# Altium footprint library cool_library.PcbLib: 1182 footprints (part 52 of 75)
Each footprint in its own frame and in the unit in brackets; x right, y up, seen from the top. Pads: shape width x height; smd on the part's side, far side on the other; paste and mask are expansions set on the pad; w line width, h text height; cw(c..) or ccw(c..) is an arc to the next point about the centre after c.
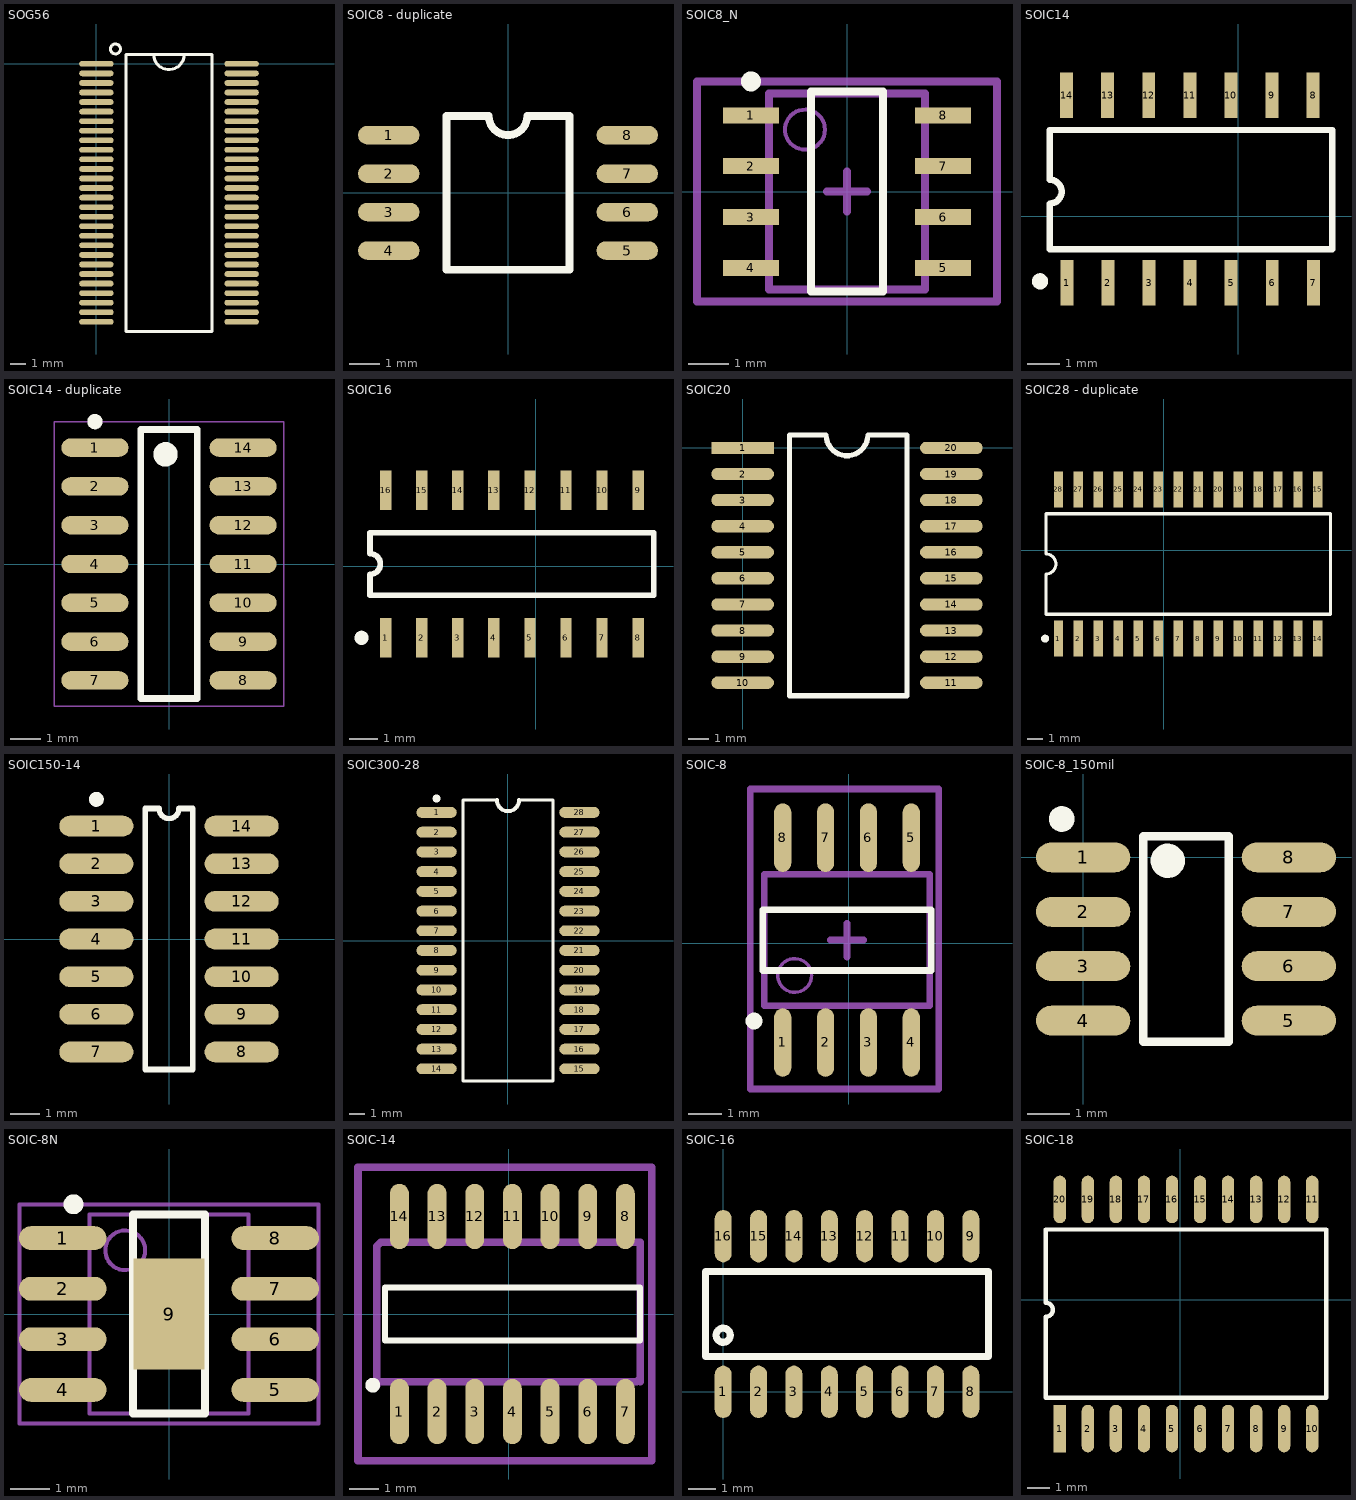
[diagram p51: the footprints below, top view; thin cyan lines are the x and y axes]

## SOG56 [mil]
pads (56):
  oval 90x15 smd: 1(0,0) 2(0,-25) 3(0,-50) 4(0,-75) 5(0,-100) 6(0,-125) 7(0,-150) 8(0,-175) 9(0,-200) 10(0,-225) 11(0,-250) 12(0,-275) 13(0,-300) 14(0,-325) 15(0,-350) 16(0,-375) 17(0,-400) 18(0,-425) 19(0,-450) 20(0,-475) 21(0,-500) 22(0,-525) 23(0,-550) 24(0,-575) 25(0,-600) 26(0,-625) 27(0,-650) 28(0,-675) 29(380,-675) 30(380,-650) 31(380,-625) 32(380,-600) 33(380,-575) 34(380,-550) 35(380,-525) 36(380,-500) 37(380,-475) 38(380,-450) 39(380,-425) 40(380,-400) 41(380,-375) 42(380,-350) 43(380,-325) 44(380,-300) 45(380,-275) 46(380,-250) 47(380,-225) 48(380,-200) 49(380,-175) 50(380,-150) 51(380,-125) 52(380,-100) 53(380,-75) 54(380,-50) 55(380,-25) 56(380,0)
Top Overlay:
  circle w8: c49.96,39 r13.04
  lines w8: 149.88,25 ccw(c189.88,25) 229.88,25 ; 78,-700 302,-700 302,25 78,25 78,-700

## SOIC8 - duplicate [mil]
pads (8):
  oval 80x24 smd: 1(-155,75) 2(-155,25) 3(-155,-25) 4(-155,-75) 5(155,-75) 6(155,-25) 7(155,25) 8(155,75)
Top Overlay:
  lines w10: -80,-100 -80,100 -25,100 ccw(c0,100) 25,100 80,100 80,-100 -80,-100
3D body: height 90.55, standoff -0.78, extent -167.2,-105.9 163.21,105.91

## SOIC8_N [mm] "SOIC, 8-Leads, Body 4.9x3.9mm, Pitch 1.27mm, IPC Medium Density"
height 1.75
pads (8):
  rect 1.4x0.4 smd: 1(-2.4,1.905) 2(-2.4,0.635) 3(-2.4,-0.635) 4(-2.4,-1.905) 5(2.4,-1.905) 6(2.4,-0.635) 7(2.4,0.635) 8(2.4,1.905)
Top Overlay:
  circle w0.25: c-2.4,2.755 r0.125
  lines w0.2: -0.9,-2.5 -0.9,2.5 0.9,2.5 0.9,-2.5 -0.9,-2.5
Mechanical 13:
  circle w0.1: c-1.05,1.55 r0.5
  lines w0.2: -1.95,-2.45 -1.95,2.45 1.95,2.45 1.95,-2.45 -1.95,-2.45
Mechanical 15:
  lines w0.2: -0.5,0 0.5,0 ; 0,-0.5 0,0.5 ; -3.75,-2.75 -3.75,2.75 3.75,2.75 3.75,-2.75 -3.75,-2.75
3D body: height 1.75, standoff 0, extent -1.95,-2.45 1.95,2.45

## SOIC14 [mm]
pads (14):
  rect 0.4x1.4 smd: 1(-5.3,-2.059) 2(-4.03,-2.059) 3(-2.76,-2.059) 4(-1.49,-2.059) 5(-0.22,-2.059) 6(1.05,-2.059) 7(2.32,-2.059) 8(2.31,3.73) 9(1.04,3.73) 10(-0.23,3.73) 11(-1.5,3.73) 12(-2.77,3.73) 13(-4.04,3.73) 14(-5.31,3.73)
Top Overlay:
  circle w0.25: c-6.13,-2.019 r0.125
  lines w0.2: -5.835,0.35 -5.835,-1.029 2.91,-1.029 2.91,2.66 -5.835,2.66 -5.835,1.13 ; -5.83,0.387 ccw(c-5.83,0.753) -5.83,1.12

## SOIC14 - duplicate [mm]
height 1.75
pads (14):
  oval 2.2x0.6 smd: 1(-2.425,3.81) 2(-2.425,2.54) 3(-2.425,1.27) 4(-2.425,0) 5(-2.425,-1.27) 6(-2.425,-2.54) 7(-2.425,-3.81) 8(2.425,-3.81) 9(2.425,-2.54) 10(2.425,-1.27) 11(2.425,0) 12(2.425,1.27) 13(2.425,2.54) 14(2.425,3.81)
Top Overlay:
  circle w0.25: c-2.425,4.66 r0.125
  circle w0.4: c-0.115,3.59 r0.2
  lines w0.22: -0.925,-4.4 -0.925,4.4 0.925,4.4 0.925,-4.4 -0.925,-4.4
Mechanical 15:
  lines w0.05: -3.75,-4.65 -3.75,4.65 3.75,4.65 3.75,-4.65 -3.75,-4.65
3D body: height 1.75, standoff 0, extent -2.896,-4.237 2.904,4.293

## SOIC16 [mm]
pads (16):
  rect 0.4x1.4 smd: 1(-5.28,-2.529) 2(-4.01,-2.529) 3(-2.74,-2.529) 4(-1.47,-2.529) 5(-0.2,-2.529) 6(1.07,-2.529) 7(2.34,-2.529) 8(3.61,-2.529) 9(3.61,2.671) 10(2.34,2.671) 11(1.07,2.671) 12(-0.2,2.671) 13(-1.47,2.671) 14(-2.74,2.671) 15(-4.01,2.671) 16(-5.28,2.671)
Top Overlay:
  circle w0.25: c-6.13,-2.529 r0.125
  lines w0.2: -5.835,-1.029 -5.835,-0.296 ccw(c-5.835,0.071) -5.835,0.438 -5.835,1.171 4.165,1.171 4.165,-1.029 -5.835,-1.029

## SOIC20 [mm]
pads (20):
  rect 3.048x0.6 smd: 1(0,0)
  oval 3.048x0.6 smd: 2(0,-1.27) 3(0,-2.54) 4(0,-3.81) 5(0,-5.08) 6(0,-6.35) 7(0,-7.62) 8(0,-8.89) 9(0,-10.16) 10(0,-11.43) 11(10.16,-11.43) 12(10.16,-10.16) 13(10.16,-8.89) 14(10.16,-7.62) 15(10.16,-6.35) 16(10.16,-5.08) 17(10.16,-3.81) 18(10.16,-2.54) 19(10.16,-1.27) 20(10.16,0)
Top Overlay:
  lines w0.254: 2.286,-12.065 2.286,0.635 4.064,0.635 ccw(c5.08,0.635) 6.096,0.635 8.001,0.635 8.001,-12.065 2.286,-12.065
3D body: height 2.65, standoff 0, extent -0.045,-12.09 10.255,0.71

## SOIC28 - duplicate [mm]
pads (28):
  rect 0.6x2.3 smd: 1(-6.714,-5.635) 2(-5.444,-5.635) 3(-4.174,-5.635) 4(-2.904,-5.635) 5(-1.634,-5.635) 6(-0.364,-5.635) 7(0.906,-5.635) 8(2.176,-5.635) 9(3.446,-5.635) 10(4.716,-5.635) 11(5.986,-5.635) 12(7.256,-5.635) 13(8.526,-5.635) 14(9.796,-5.635) 15(9.796,3.865) 16(8.526,3.865) 17(7.256,3.865) 18(5.986,3.865) 19(4.716,3.865) 20(3.446,3.865) 21(2.176,3.865) 22(0.906,3.865) 23(-0.364,3.865) 24(-1.634,3.865) 25(-2.904,3.865) 26(-4.174,3.865) 27(-5.444,3.865) 28(-6.714,3.865)
Top Overlay:
  circle w0.25: c-7.564,-5.635 r0.125
  lines w0.2: -7.509,-4.085 10.591,-4.085 10.591,2.315 -7.509,2.315 -7.509,-0.25 cw(c-7.509,-0.885) -7.509,-1.52 -7.509,-4.085

## SOIC150-14 [mm] "SOIC, 14-Leads, Body 8.7x3.9mm, Pitch 1.27mm, IPC Low Density"
height 1.76
pads (14):
  oval 2.5x0.7 smd: 1(-2.45,3.81) 2(-2.45,2.54) 3(-2.45,1.27) 4(-2.45,0) 5(-2.45,-1.27) 6(-2.45,-2.54) 7(-2.45,-3.81) 8(2.45,-3.81) 9(2.45,-2.54) 10(2.45,-1.27) 11(2.45,0) 12(2.45,1.27) 13(2.45,2.54) 14(2.45,3.81)
Top Overlay:
  circle w0.25: c-2.45,4.71 r0.125
  lines w0.178: -0.336,4.4 ccw(c0,4.4) 0.336,4.4
  lines w0.2: -0.8,4.4 -0.8,-4.4 0.8,-4.4 0.8,4.4
  lines w0.203: -0.8,4.4 -0.336,4.4 ; 0.336,4.4 0.8,4.4

## SOIC300-28 [mm] "SOIC, 28-Leads, Body 17.9x7.5mm, Pitch 1.27mm, IPC Low Density"
height 2.65
pads (28):
  oval 2.6x0.7 smd: 1(-4.6,8.255) 2(-4.6,6.985) 3(-4.6,5.715) 4(-4.6,4.445) 5(-4.6,3.175) 6(-4.6,1.905) 7(-4.6,0.635) 8(-4.6,-0.635) 9(-4.6,-1.905) 10(-4.6,-3.175) 11(-4.6,-4.445) 12(-4.6,-5.715) 13(-4.6,-6.985) 14(-4.6,-8.255) 15(4.6,-8.255) 16(4.6,-6.985) 17(4.6,-5.715) 18(4.6,-4.445) 19(4.6,-3.175) 20(4.6,-1.905) 21(4.6,-0.635) 22(4.6,0.635) 23(4.6,1.905) 24(4.6,3.175) 25(4.6,4.445) 26(4.6,5.715) 27(4.6,6.985) 28(4.6,8.255)
Top Overlay:
  circle w0.25: c-4.6,9.155 r0.125
  lines w0.2: -2.9,9.05 -2.9,-9.05 2.9,-9.05 2.9,9.05
  lines w0.203: -2.9,9.05 -0.715,9.05 ; 0.715,9.05 2.9,9.05
  lines w0.254: -0.715,9.05 ccw(c0,9.05) 0.715,9.05

## SOIC-8 [mil]
pads (8):
  oval 20x80 smd: 1(-77.09,-115.71) 2(-27.09,-115.71) 3(22.91,-115.71) 4(72.91,-115.71) 5(72.91,123.27) 6(22.91,123.27) 7(-27.09,123.27) 8(-77.09,123.27)
Top Overlay:
  circle w9.84: c-110.55,-90.71 r4.92
  lines w7.87: -100.51,-31.65 96.34,-31.65 96.34,39.21 -100.51,39.21 -100.51,-31.65
Mechanical 13:
  circle w3.94: c-63.11,-37.56 r19.68
  lines w7.87: -98.54,-72.99 94.37,-72.99 94.37,80.55 -98.54,80.55 -98.54,-72.99
Mechanical 15:
  lines w7.87: -21.77,3.78 17.6,3.78 ; -2.09,-15.91 -2.09,23.46 ; -115,-170 105,-170 105,180 -115,180 -115,-170
3D body: height 66.93, standoff 0, extent -96.46,-113.1 96.46,123.12

## SOIC-8_150mil [mm]
height 8.23
pads (8):
  oval 2.2x0.7 smd: 1(0,0) 2(0,-1.27) 3(0,-2.54) 4(0,-3.81) 5(4.8,-3.81) 6(4.8,-2.54) 7(4.8,-1.27) 8(4.8,0)
Top Overlay:
  circle w0.4: c1.975,-0.08 r0.2
  circle w0.3: c-0.5,0.895 r0.15
  lines w0.2: 1.4,-4.305 3.4,-4.305 3.4,0.495 1.4,0.495 1.4,-4.305

## SOIC-8N [mm] "SOIC, has a pad under it"
height 1.75
pads (9):
  oval 2.2x0.6 smd: 1(-2.667,1.905) 2(-2.667,0.635) 3(-2.667,-0.635) 4(-2.667,-1.905) 5(2.667,-1.905) 6(2.667,-0.635) 7(2.667,0.635) 8(2.667,1.905)
  rect 1.778x2.794 smd: 9(0,0)
Top Overlay:
  circle w0.25: c-2.4,2.755 r0.125
  lines w0.2: -0.9,-2.5 -0.9,2.5 0.9,2.5 0.9,-2.5 -0.9,-2.5
Mechanical 13:
  circle w0.1: c-1.1,1.6 r0.5
  lines w0.1: -2,-2.5 -2,2.5 2,2.5 2,-2.5 -2,-2.5
Mechanical 15:
  lines w0.1: -0.5,0 0.5,0 ; 0,-0.5 0,0.5 ; -3.75,-2.75 -3.75,2.75 3.75,2.75 3.75,-2.75 -3.75,-2.75
3D body: height 1.7, standoff 0, extent -3,-2.45 3,2.45

## SOIC-14 [mm]
pads (14):
  oval 0.635x2.2 smd: 1(-3.683,-3.289) 2(-2.413,-3.289) 3(-1.143,-3.289) 4(0.127,-3.289) 5(1.397,-3.289) 6(2.667,-3.289) 7(3.937,-3.289) 8(3.937,3.289) 9(2.667,3.289) 10(1.397,3.289) 11(0.127,3.289) 12(-1.143,3.289) 13(-2.413,3.289) 14(-3.683,3.289)
Top Overlay:
  circle w0.25: c-4.583,-2.4 r0.125
  lines w0.2: -4.173,-0.9 4.427,-0.9 4.427,0.9 -4.173,0.9 -4.173,-0.9
Mechanical 13:
  lines w0.254: -4.445,-2.413 -4.445,2.286 -4.318,2.413 4.445,2.413 4.445,-2.286 ; -4.445,-2.286 4.318,-2.286 4.445,-2.159
Mechanical 15:
  lines w0.254: -5.08,-4.953 -5.08,4.953 4.826,4.953 4.826,-3.556 4.826,-4.953 -5.08,-4.953
3D body: height 1.61, standoff 0, extent -4.223,-3.1 4.477,3.1

## SOIC-16 [mil]
pads (16):
  oval 24x74 smd: 1(0,0) 2(50,0) 3(100,0) 4(150,0) 5(200,0) 6(250,0) 7(300,0) 8(350,0) 9(350,220) 10(300,220) 11(250,220) 12(200,220) 13(150,220) 14(100,220) 15(50,220) 16(0,220)
Top Overlay:
  circle w10: c0,80 r10
  lines w10: -25,50 -25,170 375,170 375,50 -25,50
3D body: height 68.9, standoff 0, extent -18.83,-5 367,223.35

## SOIC-18 [mil]
pads (20):
  rect 22x85 smd: 1(-215,-230)
  oval 22x85 smd: 2(-165,-230) 3(-115,-230) 4(-65,-230) 5(-15,-230) 6(35,-230) 7(85,-230) 8(135,-230) 9(185,-230) 10(235,-230) 11(235,178.7) 12(185,178.7) 13(135,178.7) 14(85,178.7) 15(35,178.7) 16(-15,178.7) 17(-65,178.7) 18(-115,178.7) 19(-165,178.7) 20(-215,178.7)
Top Overlay:
  lines w7.87: -240,-175 -240,-30.65 ccw(c-240,-18.15) -240,-5.65 -240,125 260,125 260,-175 -240,-175
3D body: height 106.3, standoff 3.94, extent -240.02,-200.02 260.02,165.02